# Altium footprint library BARKO_PCBLIB.PcbLib: 531 footprints (part 13 of 34)
Each footprint in its own frame and in the unit in brackets; x right, y up, seen from the top. Pads: shape width x height; smd on the part's side, far side on the other; paste and mask are expansions set on the pad; w line width, h text height; cw(c..) or ccw(c..) is an arc to the next point about the centre after c.
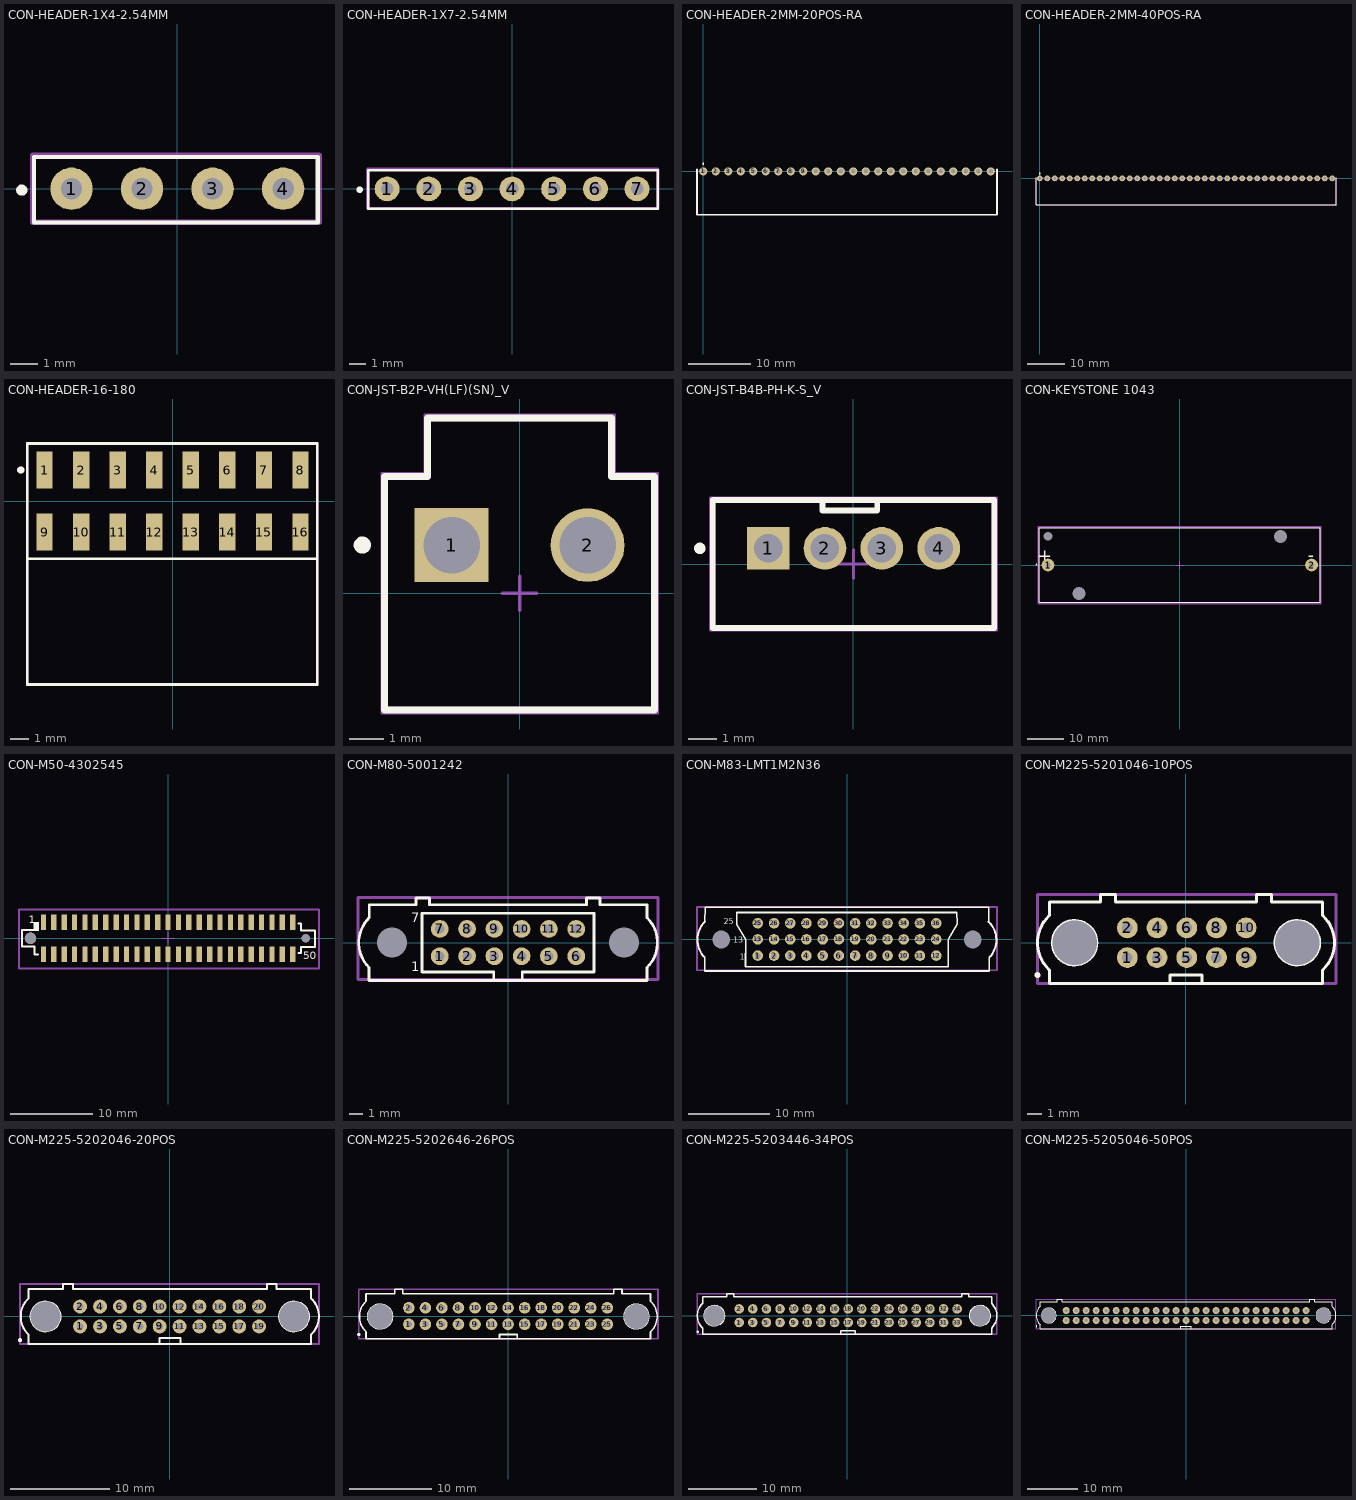
[diagram p12: the footprints below, top view; thin cyan lines are the x and y axes]

## CON-HEADER-1X4-2.54MM [mil]
pads (4):
  round 60 hole 30: 1(-150,0) 2(-50,0) 3(50,0) 4(150,0)
Top Overlay:
  circle w7.87: c-220.47,-1.99 r3.94
  lines w6: -203,-48 -203,45 199,45 199,-48 -203,-48
ASM Top:
  lines w7.87: -204.72,-47.24 -204.72,47.24 200.79,47.24 200.79,-47.24 -204.72,-47.24
  text ".designator" at -55.12,-15.75 h31.5
3D body "Header_Male_4Pin.STEP": height 356.22, standoff -98.11, extent -203,-51 197,47.03

## CON-HEADER-1X7-2.54MM [mil]
pads (7):
  round 60 hole 30: 1(-300,0) 2(-200,0) 3(-100,0) 4(0,0) 5(100,0) 6(200,0) 7(300,0)
Top Overlay:
  circle w7.87: c-366.14,-2.01 r3.94
  lines w6: -345,-48 350,-48 350,45 -345,45 -345,-48
ASM Top:
  lines w7.87: 348.58,45.43 350.39,47.24 350.39,-47.24 -346.46,-47.24 -346.46,47.24 348.58,47.24 349.49,46.34
  text ".designator" at -39.37,-7.87 h31.5
3D body "Header_Male_7Pin.STEP": height 336.22, standoff -118.11, extent -348,-51.01 352,47.01

## CON-HEADER-2MM-20POS-RA [mm]
pads (24):
  round 1.3 hole 0.75: 1(0,0) 2(2,0) 3(4,0) 4(6,0) 5(8,0) 6(10,0) 7(12,0) 8(14,0) 9(16,0) 10(18,0) 11(20,0) 12(22,0) 13(24,0) 14(26,0) 15(28,0) 16(30,0) 17(32,0) 18(34,0) 19(36,0) 20(38,0) 21(40,0) 22(42,0) 23(44,0) 24(46,0)
Top Overlay:
  circle w0.2: c0,1.2 r0.1
  lines w0.254: -1,0.3 -1,-6.95 47,-6.95 47,0.3
3D body "24POSHEADERRA.stp": height 2, standoff -2.8, extent -1,-6.95 47,0.3

## CON-HEADER-2MM-40POS-RA [mil]
pads (40):
  round 60 hole 30: 1(0,0) 2(78.74,0) 3(157.48,0) 4(236.22,0) 5(314.96,0) 6(393.7,0) 7(472.44,0) 8(551.18,0) 9(629.92,0) 10(708.66,0) 11(787.4,0) 12(866.14,0) 13(944.88,0) 14(1023.62,0) 15(1102.36,0) 16(1181.1,0) 17(1259.84,0) 18(1338.58,0) 19(1417.32,0) 20(1496.06,0) 21(1574.8,0) 22(1653.54,0) 23(1732.28,0) 24(1811.02,0) 25(1889.76,0) 26(1968.5,0) 27(2047.24,0) 28(2125.98,0) 29(2204.72,0) 30(2283.46,0) 31(2362.2,0) 32(2440.94,0) 33(2519.68,0) 34(2598.43,0) 35(2677.17,0) 36(2755.91,0) 37(2834.65,0) 38(2913.39,0) 39(2992.13,0) 40(3070.87,0)
Top Overlay:
  circle w7.87: c0,51.18 r3.94
  lines w10: -39.37,7.87 -39.37,-277.56 3110.24,-277.56 ; 3110.24,7.87 3110.24,-277.56 ; 3110.24,-277.56 3110.24,-277.56
ASM Top:
  lines w10: 3110.24,7.87 -39.37,7.87 -39.37,-277.25 3110.15,-277.25 3110.24,-277.17 3110.24,7.87 ; 3110.24,7.87 3110.24,7.87
  text ".designator" at 1354.33,-153.54 h31.5
3D body "pcb_header_40pos.stp": height 82.68, standoff -106.3, extent -39.37,-277.56 3110.24,7.87

## CON-HEADER-16-180 [mm]
pads (16):
  rect 0.89x2.03 smd: 1(-7,1.695) 2(-5,1.695) 3(-3,1.695) 4(-1,1.695) 5(1,1.695) 6(3,1.695) 7(5,1.695) 8(7,1.695) 9(-7,-1.695) 10(-5,-1.695) 11(-3,-1.695) 12(-1,-1.695) 13(1,-1.695) 14(3,-1.695) 15(5,-1.695) 16(7,-1.695)
Top Overlay:
  circle w0.2: c-8.3,1.7 r0.1
  lines w0.152: -7.95,-3.15 -7.95,-9.855 -7.95,-10.033 7.925,-10.033 7.925,-9.855 7.925,-3.15 ; -7.95,-3.15 -7.95,3.15 7.925,3.15 7.925,-3.15 ; -7.95,-3.15 7.925,-3.15
ASM Top:
  lines w0.152: -7.95,-10.033 -7.95,3.15 7.925,3.15 7.925,-10.033 -7.95,-10.033
  text ".designator" at -7.62,-1.905 h0.8
3D body "Pin Header 16 position 180 degree.stp": height 4.01, standoff 0.01, extent -8.024,-9.934 7.976,2.286

## CON-JST-B2P-VH(LF)(SN)_V [mm] "THD, 2-Leads, Body 8.5x7.86mm, Pitch 3.96mm"
height 10.9
pads (2):
  rect 2.15x2.15 hole 1.65: 1(-1.98,1.4)
  round 2.15 hole 1.65: 2(1.98,1.4)
Top Overlay:
  circle w0.25: c-4.58,1.4 r0.125
  lines w0.2: -3.93,-3.4 -3.93,3.4 -2.68,3.4 -2.68,5.1 2.68,5.1 2.68,3.4 3.93,3.4 3.93,-3.4 -3.93,-3.4
Mechanical 15:
  lines w0.05: -4.03,-3.5 4.03,-3.5 4.03,3.5 2.78,3.5 2.78,5.2 -2.78,5.2 -2.78,3.5 -4.03,3.5 -4.03,-3.5
  lines w0.1: -0.5,0 0.5,0 ; 0,-0.5 0,0.5
ASM Top:
  lines w0.2: -3.93,-3.4 3.93,-3.4 3.93,3.4 2.68,3.4 2.68,5.1 -2.68,5.1 -2.68,3.4 -3.93,3.4 -3.93,-3.4
  text ".designator" at -1.16,0.07 h0.8
3D body "User Library-B2P-VH.STEP": height 10.9, standoff -3.7, extent -3.93,-3.2 3.93,5.3

## CON-JST-B4B-PH-K-S_V [mm] "Connector, 4-Leads, Body 9.9x4.5mm, Pitch 2mm"
height 6
pads (4):
  rect 1.5x1.5 hole 1: 1(-3,0.55)
  round 1.5 hole 1: 2(-1,0.55) 3(1,0.55) 4(3,0.55)
Top Overlay:
  circle w0.2: c-5.4,0.55 r0.1
  lines w0.15: -1.088,1.882 -1.086,1.88 ; 0.83,1.88 0.837,1.887
  lines w0.2: -1.088,1.882 -1.088,2.25 ; -1.086,1.88 0.83,1.88 ; 0.837,1.887 0.837,2.25 ; -4.95,-2.25 -4.95,2.25 4.95,2.25 4.95,-2.25 -4.95,-2.25
Mechanical 15:
  lines w0.05: -5.05,-2.35 5.05,-2.35 5.05,2.35 -5.05,2.35 -5.05,-2.35
  lines w0.1: -0.5,0 0.5,0 ; 0,-0.5 0,0.5
ASM Top:
  lines w0.2: -4.95,-2.25 -4.95,2.25 4.95,2.25 4.95,-2.25 -4.95,-2.25
  text ".designator" at -0.676,-0.126 h0.8
3D body "B4B-PH-K-S.STEP": height 6.01, standoff -3.39, extent -4.95,-2.25 4.95,2.25

## CON-KEYSTONE 1043 [mm]
height 16
pads (5):
  round 3.5 hole 1.32 unplated: 1(-36.11,0) 2(36.11,0)
  rect 0x0 hole 2.39 unplated: M(-36.11,7.87)
  rect 0x0 hole 3.55 unplated: M(-27.6,-7.87) M(27.6,7.87)
Top Overlay:
  circle w0.2: c-39.3,0.1 r0.1
  lines w0.2: -38.5,-10.25 38.5,-10.25 38.5,10.25 -38.5,10.25 -38.5,-10.25
  text "-" at 36.8,4.85 h6
  text "+" at -35,5.15 h6
Mechanical 13:
  lines w0.1: -38.525,-10.325 38.525,-10.325 38.525,10.325 -38.525,10.325 -38.525,-10.325
Mechanical 15:
  lines w0.05: -38.8,-10.6 38.8,-10.6 38.8,10.6 -38.8,10.6 -38.8,-10.6
  lines w0.2: -1,0 1,0 ; 0,-1 0,1
ASM Top:
  lines w0.2: -38.5,-10.3 -38.5,10.3 38.5,10.3 38.5,-10.3 -38.5,-10.3
  text ".designator" at -1,0.2 h0.8
3D body "Keystone - PN1043.step": height 14.86, standoff -3.56, extent -38.527,-10.325 38.527,10.325

## CON-M50-4302545 [mm]
pads (52):
  rect 0.65x1.9 smd mask+0.05: 1(-15.24,1.95) 2(-13.97,1.95) 3(-12.7,1.95) 4(-11.43,1.95) 5(-10.16,1.95) 6(-8.89,1.95) 7(-7.62,1.95) 8(-6.35,1.95) 9(-5.08,1.95) 10(-3.81,1.95) 11(-2.54,1.95) 12(-1.27,1.95) 13(0,1.95) 14(1.27,1.95) 15(2.54,1.95) 16(3.81,1.95) 17(5.08,1.95) 18(6.35,1.95) 19(7.62,1.95) 20(8.89,1.95) 21(10.16,1.95) 22(11.43,1.95) 23(12.7,1.95) 24(13.97,1.95) 25(15.24,1.95) 26(-15.24,-1.95) 27(-13.97,-1.95) 28(-12.7,-1.95) 29(-11.43,-1.95) 30(-10.16,-1.95) 31(-8.89,-1.95) 32(-7.62,-1.95) 33(-6.35,-1.95) 34(-5.08,-1.95) 35(-3.81,-1.95) 36(-2.54,-1.95) 37(-1.27,-1.95) 38(0,-1.95) 39(1.27,-1.95) 40(2.54,-1.95) 41(3.81,-1.95) 42(5.08,-1.95) 43(6.35,-1.95) 44(7.62,-1.95) 45(8.89,-1.95) 46(10.16,-1.95) 47(11.43,-1.95) 48(12.7,-1.95) 49(13.97,-1.95) 50(15.24,-1.95)
  round 1.4 hole 1.4: MP1(-16.82,0)
  round 1 hole 1: MP2(16.82,0)
Top Overlay:
  rectangle: -16.325,0.875 -15.775,1.975
  lines w0.254: -15.9,-2 -16.325,-2 -16.325,-1.025 -17.875,-1.025 -17.85,1 -16.325,1 -16.325,1.85 -15.9,1.85 ; 15.925,-1.775 16.225,-1.775 16.225,-1.05 17.975,-1.05 17.975,0.975 16.225,0.975 16.225,1.825 15.925,1.825
  text "50" at 16.525,-2.875 h1.6
  text "1" at -17.05,1.55 h1.6
Mechanical 15:
  lines w0.15: -0.8,0 0,0 ; 0,-0.8 0,0 ; 0,0.8 0,0 ; 0.8,0 0,0
  lines w0.254: -18.225,-3.7 -18.225,3.525 18.45,3.525 18.45,-3.7 -18.225,-3.7
3D body "M50-4302545.stp": height 4.6, standoff -0.9, extent -17.725,-2.375 17.775,2.42

## CON-M80-5001242 [mm] "6+6 Pos. Male DIL Vertical Throughboard Conn. Jackscrews"
pads (16):
  round 1.3 hole 0.7: 1(-5,-1) 1(-5,-1) 2(-3,-1) 3(-1,-1) 4(1,-1) 5(3,-1) 6(5,-1) 7(-5,1) 7(-5,1) 8(-3,1) 9(-1,1) 10(1,1) 11(3,1) 12(5,1)
  round 0 hole 2.2 unplated: MP1(-8.5,0) MP2(8.5,0)
Top Overlay:
  lines w0.2: -10.2,-2.775 10.2,-2.775 10.2,-1.825 ccw(c8.375,0) 10.2,1.825 10.2,2.775 6.75,2.775 6.75,3.275 5.75,3.275 5.75,2.775 -5.75,2.775 -5.75,3.275 -6.75,3.275 -6.75,2.775 -10.175,2.775 -10.175,1.825 ccw(c-8.363,-0.012) -10.2,-1.825 -10.2,-2.775 ; -6.3,-2.15 -6.3,2.15 6.3,2.15 6.3,-2.15 1.05,-2.15 1.05,-2.775 1.025,-2.775 -1.05,-2.775 -1.05,-2.15 -6.3,-2.15
  text "7" at -7.1,1.5 h0.7
  text "1" at -7.1,-2.1 h0.7
ASM Top:
  lines w0.2: -11,-2.7 11,-2.7 11,3.3 -11,3.3 -11,-2.7
  text ".designator" at -0.5,0 h0.8
3D body "m80-5001205_asm.stp": height 5.61, standoff -3.24, extent -11,-2.775 11,3.275

## CON-M83-LMT1M2N36 [mm] "Connector Header Through Hole 36 position 0.079\" (2.00mm)"
pads (56):
  round 1.3 hole 0.65: 1(-11,-2) 1(-11,-2) 2(-9,-2) 3(-7,-2) 4(-5,-2) 5(-3,-2) 6(-1,-2) 7(1,-2) 8(3,-2) 9(5,-2) 10(7,-2) 11(9,-2) 12(11,-2) 13(-11,0) 13(-11,0) 14(-9,0) 15(-7,0) 16(-5,0) 17(-3,0) 18(-1,0.025) 19(1,0) 20(3,0) 21(5,0) 22(7,0) 23(9,0) 24(11,0) 25(-11,2) 25(-11,2) 26(-9,2) 27(-7,2) 28(-5,2) 29(-3,2) 30(-1,2) 31(1,2) 32(3,2) 33(5,2) 34(7,2) 35(9,2) 36(11,2)
  round 0 hole 2.2: 2(-15.5,0) 2(15.5,0)
  round 0 on Top Overlay: entry(-12.9,2.4) entry(-12.8,2.2) entry(-12.8,2.2) entry(-12.8,2.2) entry(-12.8,2.6) entry(-12.8,2.6) entry(-12.5,2.3)
  oval 0.1x0 on Top Overlay: entry(-12.8,2.2)
  round 0 on Drill Guide: entry(-12.8,2.6) entry(-12.8,2.6) entry(-12.8,2.6) entry(-12.5,2.1) entry(-12.4,2.3) entry(-12.4,2.3) entry(-12.1,1.8)
Top Overlay:
  lines w0.2: -17.55,-2.225 -17.55,-3.9 17.55,-3.9 ; -17.525,2.2 -17.5,3.95 17.5,3.95 17.475,2.175 ; 17.55,-3.875 17.55,-2.225 ; -13.575,1.85 -13.575,3.325 13.55,3.325 13.575,1.9 12.5,0 12.5,-3.35 -12.525,-3.35 -12.5,0 -13.575,1.85
  lines w0.254: -17.55,-2.225 cw(c-15.325,-0.025) -17.525,2.2 ; 17.475,2.175 cw(c15.312,-0.062) 17.55,-2.225
  text "25" at -15.2,1.9 h0.7
  text "13" at -14,-0.4 h0.7
  text "1" at -13.2,-2.5 h0.7
ASM Top:
  lines w0.2: -18.5,-3.8 -18.5,4 18.5,4 18.5,-3.8 -18.5,-3.8
  text ".designator" at 0.2,-0.1 h0.8
3D body "m83-lmt1m2n36-0000-000_asm.stp": height 6.11, standoff -4.49, extent -18.5,-3.85 18.5,3.85

## CON-M225-5201046-10POS [mm]
pads (12):
  round 1.4 hole 0.7: 1(-3.95,-1) 2(-3.95,1) 3(-1.95,-1) 4(-1.95,1) 5(0.05,-1) 6(0.05,1) 7(2.05,-1) 8(2.05,1) 9(4.05,-1) 10(4.05,1)
  round 0 hole 3 unplated: MH1(-7.5,0) MH2(7.5,0)
Top Overlay:
  circle w0.2: c-10,-2.175 r0.1
  circle w0.2: c7.5,0 r1.5
  circle w0.2: c-7.5,0 r1.5
  lines w0.2: -1.063,-2.75 -1.063,-2.175 1.062,-2.175 1.062,-2.75 ; -9.2,-2.75 9.2,-2.75 9.2,-1.833 ccw(c7.5,0) 9.2,1.833 9.2,2.75 5.75,2.75 5.75,3.25 4.75,3.25 4.75,2.75 -4.75,2.75 -4.75,3.25 -5.75,3.25 -5.75,2.75 -9.2,2.75 -9.2,1.833 ccw(c-7.5,0) -9.2,-1.833 -9.2,-2.75
ASM Top:
  lines w0.2: -10,-2.75 10.1,-2.75 10.1,3.25 -10,3.25 -10,-2.75
  text ".designator" at -2.21,-0.229 h0.8
3D body "m225-5201046_10pos.stp": height 5.45, standoff -3.4, extent -10,-2.75 10,3.25

## CON-M225-5202046-20POS [mm]
pads (22):
  round 1.4 hole 0.7: 1(-9.025,-1) 2(-9.025,1) 3(-7.025,-1) 4(-7.025,1) 5(-5.025,-1) 6(-5.025,1) 7(-3.025,-1) 8(-3.025,1) 9(-1.025,-1) 10(-1.025,1) 11(0.975,-1) 12(0.975,1) 13(2.975,-1) 14(2.975,1) 15(4.975,-1) 16(4.975,1) 17(6.975,-1) 18(6.975,1) 19(8.975,-1) 20(8.975,1)
  round 0 hole 3 unplated: MH1(-12.5,0) MH2(12.5,0)
Top Overlay:
  circle w0.2: c-12.5,0 r1.5
  circle w0.2: c12.497,0 r1.5
  circle w0.2: c-15.074,-2.381 r0.1
  lines w0.2: -9.838,3.25 -10.75,3.25 -10.75,2.75 -14.2,2.75 -14.2,1.833 ccw(c-12.5,0) -14.2,-1.833 -14.2,-2.75 14.197,-2.75 14.197,-1.833 ccw(c12.497,0) 14.197,1.833 14.197,2.75 10.75,2.75 10.75,3.25 9.75,3.25 9.75,2.75 -9.75,2.75 -9.75,3.25 ; -1.063,-2.75 -1.063,-2.175 1.062,-2.175 1.062,-2.75
ASM Top:
  lines w0.2: -15.074,-2.75 -15.074,-2.66 -15.074,3.25 15,3.25 15,-2.75 -15.074,-2.75
  text ".designator" at -2.159,-0.229 h0.8
3D body "m225-5202046_20POS.stp": height 5.45, standoff -3.4, extent -15,-2.75 15,3.25

## CON-M225-5202646-26POS [mm]
pads (28):
  round 1.4 hole 0.7: 1(-12.025,-0.95) 2(-12.025,1.05) 3(-10.025,-0.95) 4(-10.025,1.05) 5(-8.025,-0.95) 6(-8.025,1.05) 7(-6.025,-0.95) 8(-6.025,1.05) 9(-4.025,-0.95) 10(-4.025,1.05) 11(-2.025,-0.95) 12(-2.025,1.05) 13(-0.025,-0.95) 14(-0.025,1.05) 15(1.975,-0.95) 16(1.975,1.05) 17(3.975,-0.95) 18(3.975,1.05) 19(5.975,-0.95) 20(5.975,1.05) 21(7.975,-0.95) 22(7.975,1.05) 23(9.975,-0.95) 24(9.975,1.05) 25(11.975,-0.95) 26(11.975,1.05)
  round 0 hole 3: MH1(-15.5,0) MH2(15.5,0)
Top Overlay:
  circle w0.2: c-18.075,-2.175 r0.1
  circle w0.2: c-15.5,0 r1.5
  circle w0.2: c15.5,0 r1.5
  lines w0.2: -1.063,-2.7 -1.063,-2.175 1.062,-2.175 1.062,-2.7 ; -17.2,-2.7 17.2,-2.7 17.2,-1.833 ccw(c15.5,0) 17.2,1.833 17.2,2.75 13.75,2.75 13.75,3.3 12.75,3.3 12.75,2.75 -12.75,2.75 -12.75,3.3 -13.75,3.3 -13.75,2.75 -17.2,2.75 -17.2,1.833 ccw(c-15.5,0) -17.2,-1.833 -17.2,-2.7
ASM Top:
  lines w0.2: -18.075,-2.7 18.1,-2.7 18.1,3.3 -18.075,3.3 -18.075,-2.7
  text ".designator" at -1.448,-0.25 h0.8
3D body "m225-5202646_26POS.stp": height 5.45, standoff -3.4, extent -18,-2.75 18,3.25

## CON-M225-5203446-34POS [mm]
pads (36):
  round 1.4 hole 0.7: 1(-15.85,-1) 2(-15.85,1) 3(-13.85,-1) 4(-13.85,1) 5(-11.85,-1) 6(-11.85,1) 7(-9.85,-1) 8(-9.85,1) 9(-7.85,-1) 10(-7.85,1) 11(-5.85,-1) 12(-5.85,1) 13(-3.85,-1) 14(-3.85,1) 15(-1.85,-1) 16(-1.85,1) 17(0.15,-1) 18(0.15,1) 19(2.15,-1) 20(2.15,1) 21(4.15,-1) 22(4.15,1) 23(6.15,-1) 24(6.15,1) 25(8.15,-1) 26(8.15,1) 27(10.15,-1) 28(10.15,1) 29(12.15,-1) 30(12.15,1) 31(14.15,-1) 32(14.15,1) 33(16.15,-1) 34(16.15,1)
  round 0 hole 3 unplated: MH1(-19.5,0) MH2(19.5,0)
Top Overlay:
  circle w0.2: c-21.946,-2.362 r0.1
  circle w0.2: c19.5,0 r1.5
  circle w0.2: c-19.5,0 r1.5
  lines w0.2: -0.963,-2.75 -0.963,-2.175 1.162,-2.175 1.162,-2.75 ; -17.65,3.25 -16.65,3.25 -16.65,2.75 16.85,2.75 16.85,3.25 17.85,3.25 17.85,2.75 21.2,2.75 21.2,1.833 cw(c19.5,0) 21.2,-1.833 21.2,-2.75 -21.2,-2.75 -21.2,-1.833 cw(c-19.5,0) -21.2,1.833 -21.2,2.75 -17.65,2.75 -17.65,3.25 ; -17.65,3.25 -17.65,3.25
ASM Top:
  lines w0.2: -21.996,-2.75 -21.996,3.25 21.982,3.25 21.982,-2.75 -21.996,-2.75
  text ".designator" at -0.61,-0.203 h0.8
3D body "M225-5203446-34POS.stp": height 5.55, standoff -3.3, extent -21.9,-2.75 22.1,3.25

## CON-M225-5205046-50POS [mm]
pads (52):
  round 1.4 hole 0.7: 1(-24,-1) 2(-24,1) 3(-22,-1) 4(-22,1) 5(-20,-1) 6(-20,1) 7(-18,-1) 8(-18,1) 9(-16,-1) 10(-16,1) 11(-14,-1) 12(-14,1) 13(-12,-1) 14(-12,1) 15(-10,-1) 16(-10,1) 17(-8,-1) 18(-8,1) 19(-6,-1) 20(-6,1) 21(-4,-1) 22(-4,1) 23(-2,-1) 24(-2,1) 25(0,-1) 26(0,1) 27(2,-1) 28(2,1) 29(4,-1) 30(4,1) 31(6,-1) 32(6,1) 33(8,-1) 34(8,1) 35(10,-1) 36(10,1) 37(12,-1) 38(12,1) 39(14,-1) 40(14,1) 41(16,-1) 42(16,1) 43(18,-1) 44(18,1) 45(20,-1) 46(20,1) 47(22,-1) 48(22,1) 49(24,-1) 50(24,1)
  round 0 hole 3 unplated: MH1(27.5,0) MH2(-27.5,0)
Top Overlay:
  circle w0.2: c-29.947,-2.184 r0.1
  circle w0.2: c-27.5,0 r1.5
  circle w0.2: c27.5,0 r1.5
  lines w0.2: -1.063,-2.7 -1.063,-2.125 1.062,-2.125 1.062,-2.7 ; 29.194,2.8 25.75,2.8 25.75,3.3 24.75,3.3 24.75,2.8 -24.75,2.8 -24.75,3.3 -25.75,3.3 -25.75,2.8 -29.2,2.8 -29.2,1.833 ccw(c-27.5,0) -29.2,-1.833 -29.2,-2.7 29.2,-2.7 29.2,-1.833 ccw(c27.5,0) 29.2,1.833 29.2,2.8
ASM Top:
  lines w0.2: -30,-2.7 -30,3.3 30,3.3 30,-2.7 -30,-2.7
  text ".designator" at -0.61,-0.127 h0.8
3D body "M225-5205046.stp": height 5.45, standoff -3.4, extent -30,-2.7 30,3.3